# Altium footprint library esd_library.PcbLib: 41 footprints (part 3 of 3)
Each footprint in its own frame and in the unit in brackets; x right, y up, seen from the top. Pads: shape width x height; smd on the part's side, far side on the other; paste and mask are expansions set on the pad; w line width, h text height; cw(c..) or ccw(c..) is an arc to the next point about the centre after c.
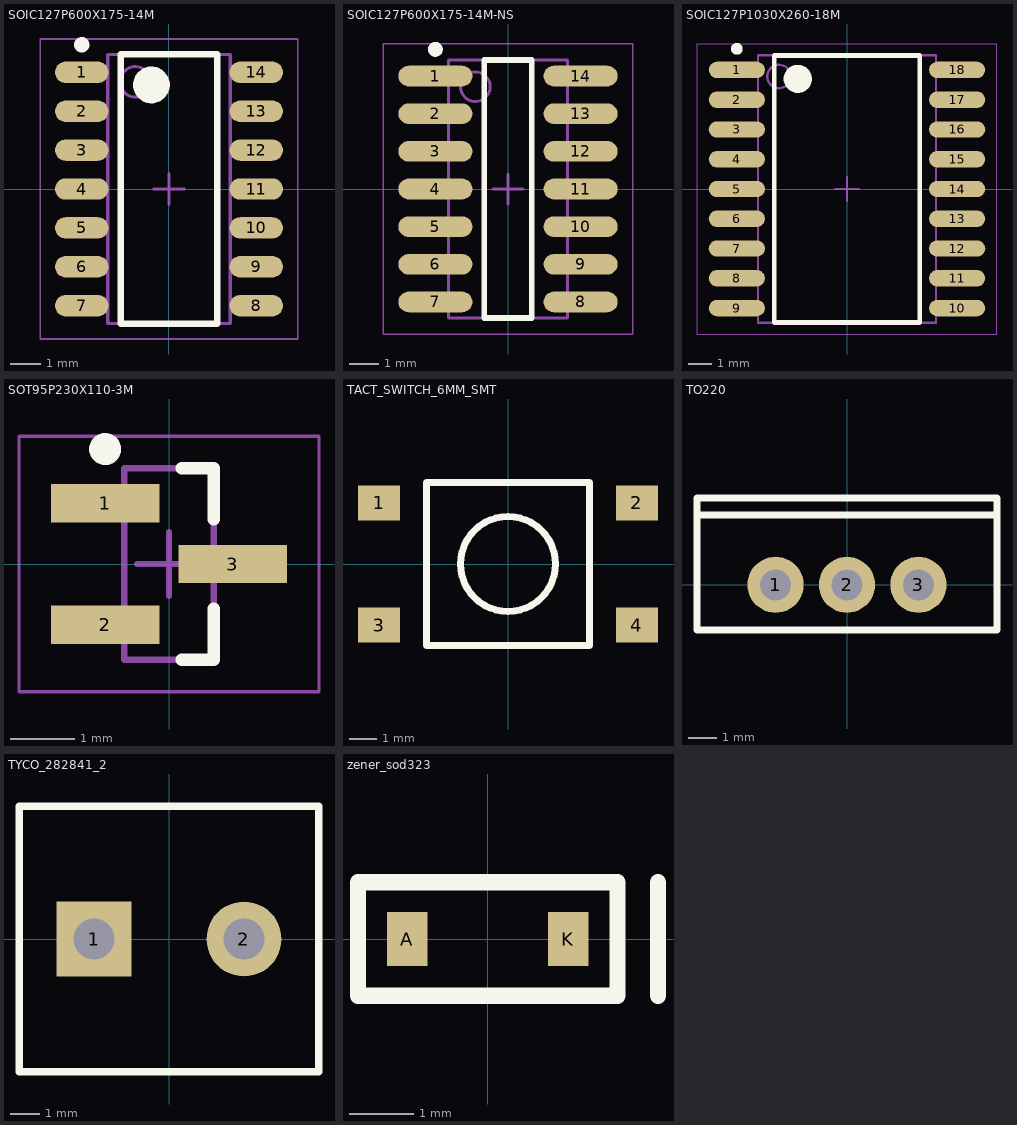
[diagram p2: the footprints below, top view; thin cyan lines are the x and y axes]

## SOIC127P600X175-14M [mm] "SOIC, 14-Leads, Body 8.65x3.90mm, Pitch 1.27mm, IPC Low Density"
height 1.75
pads (14):
  oval 1.75x0.7 smd: 1(-2.85,3.81) 2(-2.85,2.54) 3(-2.85,1.27) 4(-2.85,0) 5(-2.85,-1.27) 6(-2.85,-2.54) 7(-2.85,-3.81) 8(2.85,-3.81) 9(2.85,-2.54) 10(2.85,-1.27) 11(2.85,0) 12(2.85,1.27) 13(2.85,2.54) 14(2.85,3.81)
Top Overlay:
  circle w0.25: c-2.85,4.71 r0.125
  circle w0.6: c-0.575,3.4 r0.3
  lines w0.2: -1.575,-4.4 -1.575,4.4 1.575,4.4 1.575,-4.4 -1.575,-4.4
Mechanical 13:
  circle w0.1: c-1.1,3.5 r0.5
  lines w0.1: -2,-4.4 -2,4.4 2,4.4 2,-4.4 -2,-4.4
Mechanical 15:
  lines w0.05: -4.2,-4.9 -4.2,4.9 4.2,4.9 4.2,-4.9 -4.2,-4.9
  lines w0.1: -0.5,0 0.5,0 ; 0,-0.5 0,0.5
3D body: height 1.83, standoff 0.08, extent -3,-4.375 3,4.375

## SOIC127P600X175-14M-NS [mm] "SOIC, 14-Leads, Body 8.62x3.90mm, Pitch 1.27mm, IPC Low Density"
height 1.76
pads (14):
  oval 2.5x0.7 smd: 1(-2.45,3.81) 2(-2.45,2.54) 3(-2.45,1.27) 4(-2.45,0) 5(-2.45,-1.27) 6(-2.45,-2.54) 7(-2.45,-3.81) 8(2.45,-3.81) 9(2.45,-2.54) 10(2.45,-1.27) 11(2.45,0) 12(2.45,1.27) 13(2.45,2.54) 14(2.45,3.81)
Top Overlay:
  circle w0.25: c-2.45,4.71 r0.125
  lines w0.2: -0.8,-4.35 -0.8,4.35 0.8,4.35 0.8,-4.35 -0.8,-4.35
Mechanical 13:
  circle w0.1: c-1.1,3.45 r0.5
  lines w0.1: -2,-4.35 -2,4.35 2,4.35 2,-4.35 -2,-4.35
Mechanical 15:
  lines w0.05: -4.2,-4.9 -4.2,4.9 4.2,4.9 4.2,-4.9 -4.2,-4.9
  lines w0.1: -0.5,0 0.5,0 ; 0,-0.5 0,0.5
3D body: height 1.83, standoff 0.08, extent -3.051,-4.375 2.949,4.375

## SOIC127P1030X260-18M [mm] "SOIC, 18-Leads, Body 11.51x7.50mm, Pitch 1.27mm, IPC Low Density"
height 2.6
pads (18):
  oval 2.4x0.7 smd: 1(-4.7,5.08) 2(-4.7,3.81) 3(-4.7,2.54) 4(-4.7,1.27) 5(-4.7,0) 6(-4.7,-1.27) 7(-4.7,-2.54) 8(-4.7,-3.81) 9(-4.7,-5.08) 10(4.7,-5.08) 11(4.7,-3.81) 12(4.7,-2.54) 13(4.7,-1.27) 14(4.7,0) 15(4.7,1.27) 16(4.7,2.54) 17(4.7,3.81) 18(4.7,5.08)
Top Overlay:
  circle w0.25: c-4.7,5.98 r0.125
  circle w0.6: c-2.1,4.7 r0.3
  lines w0.2: -3.1,-5.7 -3.1,5.7 3.1,5.7 3.1,-5.7 -3.1,-5.7
Mechanical 13:
  circle w0.1: c-2.9,4.8 r0.5
  lines w0.1: -3.8,-5.7 -3.8,5.7 3.8,5.7 3.8,-5.7 -3.8,-5.7
Mechanical 15:
  lines w0.05: -6.4,-6.2 -6.4,6.2 6.4,6.2 6.4,-6.2 -6.4,-6.2
  lines w0.1: -0.5,0 0.5,0 ; 0,-0.5 0,0.5
3D body: height 2.67, standoff 0.02, extent -5.095,-5.951 5.095,5.951

## SOT95P230X110-3M [mm] "SOT23, 3-Leads, Body 2.90x2.30mm, Pitch 0.95mm, IPC Low Density"
height 1.1
pads (3):
  rect 1.7x0.6 smd: 1(-1,0.95) 2(-1,-0.95) 3(1,0)
Top Overlay:
  circle w0.25: c-1,1.8 r0.125
  lines w0.2: 0.2,-1.5 0.7,-1.5 0.7,-0.7 ; 0.2,1.5 0.7,1.5 0.7,0.7
Mechanical 13:
  lines w0.1: -0.7,-1.5 0.7,-1.5 0.7,1.5 -0.7,1.5 -0.7,-1.5
Mechanical 15:
  lines w0.05: -2.35,-2 2.35,-2 2.35,2 -2.35,2 -2.35,-2
  lines w0.1: -0.5,0 0.5,0 ; 0,-0.5 0,0.5
3D body: height 1.1, standoff 0.05, extent -0.7,-1.5 0.7,1.5

## STM32DISCOVERY [mil]
3D body: height 462, standoff 400, extent 0,0 2598.43,3897.64

## TACT_SWITCH_6MM_SMT [mm]
pads (4):
  rect 1.55x1.3 smd: 1(-4.75,2.25) 2(4.75,2.25) 3(-4.75,-2.25) 4(4.75,-2.25)
Top Overlay:
  circle w0.254: c0,0 r1.75
  lines w0.254: -3,-3 -3,3 3,3 3,-3 -3,-3
3D body: height 5.07, standoff 0.1, extent -5,-3.051 5,2.949

## TO220 [mm]
height 16.3
pads (3):
  round 2 hole 1.1: 1(-2.54,0) 2(0,0) 3(2.54,0)
Top Overlay:
  lines w0.254: -5.335,2.48 5.33,2.48 ; -5.335,-1.61 -5.335,3.09 5.335,3.09 5.335,-1.61 -5.335,-1.61
3D body: height 18.67, standoff -10.1, extent -4.925,-2.108 4.975,2.392

## TYCO_282841_2 [mil]
height 598
pads (2):
  rect 100x100 hole 55: 1(-100,0)
  round 100 hole 55: 2(100,0)
Top Overlay:
  lines w10: -200,-177 200,-177 200,177 -200,177 -200,-177
3D body: height 599.9, standoff -137.9, extent -208.84,-174.33 218.84,180

## zener_sod323 [mil]
pads (2):
  rect 25x33 smd: A(-49.75,0) K(49.75,0)
Top Overlay:
  lines w10: 105,-35 105,35 ; -80,-35 -80,35 80,35 80,-35 -80,-35
3D body: height 43.31, standoff 0, extent -52.15,-25.21 54.15,24